# Altium footprint library IC.PcbLib: 386 footprints (part 12 of 30) (continued)
## BGA1924_1.0(45x45) [mm] (continued)
Top Overlay:
  circle w0.25: c-22.845,22.629 r0.125
  region: -21.195,22.779 -22.195,21.779 -22.195,22.779
  lines w0.2: -22.195,21.779 -21.195,22.779 ; -22.195,-22.221 22.805,-22.221 22.805,22.779 -22.195,22.779 -22.195,-22.221
Mechanical 13:
  lines w0.1: -22.195,-22.221 22.805,-22.221 22.805,22.779 -22.195,22.779 -22.195,-22.221
Mechanical 15:
  lines w0.05: -22.695,-22.721 23.305,-22.721 23.305,23.279 -22.695,23.279 -22.695,-22.721
  lines w0.1: -0.195,0.279 0.805,0.279 ; 0.305,-0.221 0.305,0.779
3D body "BGA1924C100P44X44_4500X4500X335.step": height 3.35, standoff 0, extent -22.246,-22.119 22.754,22.881

## CLCC-68N [mm]
height 4.5
pads (68):
  oval 0.65x2.5 smd: 1(0.102,13.95) 2(-1.168,13.95) 3(-2.438,13.95) 4(-3.708,13.95) 5(-4.978,13.95) 6(-6.248,13.95) 7(-7.518,13.95) 8(-8.788,13.95) 9(-10.058,13.95) 27(-10.058,-13.746) 28(-8.788,-13.746) 29(-7.518,-13.746) 30(-6.248,-13.746) 31(-4.978,-13.746) 32(-3.708,-13.746) 33(-2.438,-13.746) 34(-1.168,-13.746) 35(0.102,-13.746) 36(1.372,-13.746) 37(2.642,-13.746) 38(3.912,-13.746) 39(5.182,-13.746) 40(6.452,-13.746) 41(7.722,-13.746) 42(8.992,-13.746) 43(10.262,-13.746) 61(10.262,13.95) 62(8.992,13.95) 63(7.722,13.95) 64(6.452,13.95) 65(5.182,13.95) 66(3.912,13.95) 67(2.642,13.95) 68(1.372,13.95)
  oval 2.5x0.65 smd: 10(-13.746,10.262) 11(-13.746,8.992) 12(-13.746,7.722) 13(-13.746,6.452) 14(-13.746,5.182) 15(-13.746,3.912) 16(-13.746,2.642) 17(-13.746,1.372) 18(-13.746,0.102) 19(-13.746,-1.168) 20(-13.746,-2.438) 21(-13.746,-3.708) 22(-13.746,-4.978) 23(-13.746,-6.248) 24(-13.746,-7.518) 25(-13.746,-8.788) 26(-13.746,-10.058) 44(13.899,-10.058) 45(13.899,-8.788) 46(13.899,-7.518) 47(13.899,-6.248) 48(13.899,-4.978) 49(13.899,-3.708) 50(13.899,-2.438) 51(13.899,-1.168) 52(13.899,0.102) 53(13.899,1.372) 54(13.899,2.642) 55(13.899,3.912) 56(13.899,5.182) 57(13.899,6.452) 58(13.899,7.722) 59(13.899,8.992) 60(13.899,10.262)
Top Overlay:
  circle w0.5: c0.127,15.748 r0.125
  lines w0.2: -0.148,12.802 -0.148,11.302 0.352,11.302 0.352,12.802 ; -12.598,-10.058 -12.598,10.262 -10.058,12.802 10.262,12.802 12.802,10.262 12.802,-10.058 10.262,-12.598 -10.058,-12.598 -12.598,-10.058
Mechanical 13:
  lines w0.1: -11.963,-11.963 -11.963,12.167 12.167,12.167 12.167,-11.963 -11.963,-11.963
Mechanical 15:
  lines w0.05: -14.848,-14.848 -14.848,15.052 15.052,15.052 15.052,-14.848 -14.848,-14.848
  lines w0.1: -0.398,0.102 0.602,0.102 ; 0.102,-0.398 0.102,0.602
3D body: height 7.37, standoff 1.02, extent -11.963,-11.963 12.167,12.167

## DFN6_0.5(1.5X1) [mm]
pads (6):
  rect 0.6x0.23 smd paste+0 mask+0.05: 1(-0.517,0.461) 2(-0.517,-0.039) 3(-0.517,-0.539) 4(0.534,-0.539) 5(0.534,-0.039) 6(0.534,0.461)
Top Overlay:
  circle w0.381: c-1.067,0.483 r0.008
  lines w0.08: -0.432,-0.759 0.457,-0.759 0.457,0.709 -0.432,0.709 -0.432,-0.759
3D body "MAX2659ELT+T.stp": height 0.8, standoff 0, extent -0.537,-0.783 0.563,0.717

## DFN6_0.5-PAD(2X2) [mm]
pads (7):
  rect 0.6x0.3 smd: 1(-0.975,0.449) 2(-0.975,-0.051) 3(-0.975,-0.551) 4(0.925,-0.551) 5(0.925,-0.051) 6(0.925,0.449)
  rect 0.65x1.42 smd: 7(-0.025,-0.051)
Top Overlay:
  circle w0.25: c-1.4,1.099 r0.125
Mechanical 13:
  lines w0.1: -1.025,0.449 -0.525,0.949 ; -1.025,-1.051 0.975,-1.051 0.975,0.949 -1.025,0.949 -1.025,-1.051
Mechanical 15:
  lines w0.05: -1.65,-1.351 1.6,-1.351 1.6,1.249 -1.65,1.249 -1.65,-1.351
3D body "User Library-My-DFN-6-2x2-0_5.STEP": height 0.8, standoff 0, extent -1.085,-1.101 1.035,0.999

## DFN6_0.5-PAD(2X3) [mil]
pads (7):
  rect 29.53x12 smd: 1(-57,20) 2(-57,0) 3(-57,-20) 4(57,-20) 5(57,0) 6(57,20)
  rect 55.12x51.18 smd: 7(0,0)
Top Overlay:
  circle w3.94: c-70,40 r1.97
  lines w6: -59,-39 -33,-39 ; -59,39 -33,39 ; 33,-39 59,-39 ; 33,39 59,39
3D body "User Library-My-DFN-6-2x3-0_5.STEP": height 31.5, standoff 0, extent -61.41,-41.33 61.43,41.34

## DFN6_0.65(2X2) [mm]
pads (6):
  rect 0.7x0.35 smd: 1(-0.898,0.675) 2(-0.898,0.025) 3(-0.898,-0.625) 4(0.999,-0.625) 5(0.999,0.025) 6(0.999,0.675)
Top Overlay:
  circle w0.25: c-1.299,1.35 r0.125
Mechanical 13:
  lines w0.1: -0.949,0.525 -0.449,1.025 ; -0.949,-0.975 -0.949,1.025 1.051,1.025 1.051,-0.975 -0.949,-0.975
Mechanical 15:
  lines w0.05: -1.549,-1.275 -1.549,1.325 1.651,1.325 1.651,-1.275 -1.549,-1.275
3D body "TPS61170DRVT.stp": height 0.8, standoff 0, extent -0.999,-0.975 1.101,1.025

## DFN6_0.65-PAD(2.2X2.5) [mm]
pads (7):
  rect 0.7x0.3 smd: 1(-1.2,0.625) 2(-1.2,-0.025) 3(-1.2,-0.675) 4(1.2,-0.675) 5(1.2,-0.025) 6(1.2,0.625)
  rect 0.85x1.3 smd: 7(0,-0.025)
Top Overlay:
  circle w0.25: c-1.625,1.275 r0.125
Mechanical 13:
  lines w0.1: -1.25,0.45 -0.625,1.075 ; -1.25,-1.125 1.25,-1.125 1.25,1.075 -1.25,1.075 -1.25,-1.125
Mechanical 15:
  lines w0.05: -1.875,-1.425 1.875,-1.425 1.875,1.375 -1.875,1.375 -1.875,-1.425
3D body "LP5900SD-1.5.stp": height 0.8, standoff 0, extent -1.3,-1.125 1.3,1.075

## DFN6_0.65-PAD(2X2) [mm]
pads (7):
  rect 0.6x0.35 smd: 1(-0.999,0.675) 2(-0.999,0.025) 3(-0.999,-0.625) 4(1.101,-0.625) 5(1.101,0.025) 6(1.101,0.675)
  rect 0.8x1.7 smd: 7(0.051,0.025)
Top Overlay:
  circle w0.25: c-1.299,1.35 r0.125
Mechanical 13:
  lines w0.1: -0.949,0.525 -0.449,1.025 ; -0.949,-0.975 -0.949,1.025 1.051,1.025 1.051,-0.975 -0.949,-0.975
Mechanical 15:
  lines w0.05: -1.549,-1.275 -1.549,1.325 1.651,1.325 1.651,-1.275 -1.549,-1.275
3D body "TPS61170DRVT.stp": height 0.8, standoff 0, extent -0.999,-0.975 1.101,1.025

## DFN6_0.95-PAD(3X3) [mm]
pads (7):
  rect 0.75x0.4 smd: 1(-1.45,0.925) 2(-1.45,-0.025) 3(-1.45,-0.975) 4(1.45,-0.975) 5(1.45,-0.025) 6(1.45,0.925)
  rect 1.422x2.2 smd: 7(0,-0.025)
Top Overlay:
  circle w0.25: c-1.875,1.625 r0.125
Mechanical 13:
  lines w0.1: -1.5,0.725 -0.75,1.475 ; -1.5,-1.525 1.5,-1.525 1.5,1.475 -1.5,1.475 -1.5,-1.525
Mechanical 15:
  lines w0.05: -2.125,-1.825 2.125,-1.825 2.125,1.775 -2.125,1.775 -2.125,-1.825
3D body "LP38692SD-3.3_NOPB.stp": height 0.8, standoff 0, extent -1.55,-1.525 1.55,1.475

## DFN6_1.0-PAD(3X3) [mm]
pads (7):
  rect 0.8x0.45 smd: 1(-1.425,1.076) 2(-1.425,0.076) 3(-1.425,-0.924) 4(1.475,-0.924) 5(1.475,0.076) 6(1.475,1.076)
  rect 1.27x2.5 smd: 7(0.025,0.076)
Top Overlay:
  circle w0.25: c-1.875,1.801 r0.125
Mechanical 13:
  lines w0.1: -1.475,0.826 -0.725,1.576 ; -1.475,-1.424 -1.475,1.576 1.525,1.576 1.525,-1.424 -1.475,-1.424
Mechanical 15:
  lines w0.05: -2.125,-1.749 -2.125,1.901 2.175,1.901 2.175,-1.749 -2.125,-1.749
3D body "HDC1080DMBT.stp": height 0.8, standoff 0, extent -1.525,-1.424 1.575,1.576

## DFN8_0.5(2X2) [mm]
pads (8):
  rect 0.7x0.25 smd mask+0.102: 1(-0.925,0.75) 2(-0.925,0.25) 3(-0.925,-0.25) 4(-0.925,-0.75) 5(0.925,-0.75) 6(0.925,-0.25) 7(0.925,0.25) 8(0.925,0.75)
Top Overlay:
  lines w0.2: -1.092,1.118 -0.717,1.118
Mechanical 13:
  lines w0.1: -1,-0.991 1,-0.991 1,0.965 -1,0.965 -1,-0.991
3D body "User Library-DFN08_2X2MM_LT_DC.step": height 0.75, standoff 0, extent -0.959,-1.009 1.041,0.991

## DFN8_0.5-PAD(2X2) [mm]
pads (11):
  rect 0.5x0.3 smd: 1(-1.051,0.775) 2(-1.051,0.275) 3(-1.051,-0.225) 4(-1.051,-0.725) 5(0.949,-0.725) 6(0.949,-0.225) 7(0.949,0.275) 8(0.949,0.775)
  round 0.6 hole 0.3: 9(-0.051,-0.457) 9(-0.051,0.508)
  rect 0.8x1.6 smd: 9(-0.051,0.025)
Top Overlay:
  circle w0.2: c-1.041,1.27 r0.076
Mechanical 13:
  circle w0.1: c-0.251,0.225 r0.4
  lines w0.1: -1.051,-0.975 -1.051,1.025 0.949,1.025 0.949,-0.975 -1.051,-0.975
Mechanical 15:
  lines w0.05: -1.326,-1.075 -1.326,1.125 1.224,1.125 1.224,-1.075 -1.326,-1.075
  lines w0.1: -0.551,0.025 0.449,0.025 ; -0.051,-0.475 -0.051,0.525
3D body "User Library-DFN 8-1.step": height 0.9, standoff 0, extent -1.052,-0.974 0.95,1.026

## DFN8_0.5-PAD(2X3) [mm]
pads (11):
  rect 0.25x0.7 smd mask+0.102: 1(-0.75,-1.052) 2(-0.25,-1.052) 3(0.25,-1.052) 4(0.75,-1.052) 5(0.75,0.95) 6(0.25,0.95) 7(-0.25,0.95) 8(-0.75,0.95)
  round 0.6 hole 0.3: 9(-0.508,-0.051) 9(0.483,-0.051)
  rect 2.2x0.61 smd mask+0.102: 9(0,-0.051)
Top Overlay:
  circle w0.2: c-1.473,-1.422 r0.076
  lines w0.2: -1.55,-0.726 -1.55,-1.101 -1.275,-1.101 ; -1.55,0.624 -1.55,0.999 -1.275,0.999 ; 1.275,-1.101 1.55,-1.101 1.55,-0.726 ; 1.275,0.999 1.55,0.999 1.55,0.624
Mechanical 13:
  circle w0.1: c-0.7,-0.251 r0.4
  lines w0.1: -1.5,-1.051 -1.5,0.949 1.5,0.949 1.5,-1.051 -1.5,-1.051
Mechanical 15:
  lines w0.05: -1.65,-1.426 -1.65,1.324 1.65,1.324 1.65,-1.426 -1.65,-1.426
  lines w0.1: -0.5,-0.051 0.5,-0.051 ; 0,-0.551 0,0.449
3D body "User Library-My-DFN-8-3x2-0_5.STEP": height 0.8, standoff 0, extent -1.55,-1.092 1.55,1.028

## DFN8_0.5-PAD(3X2) [mm]
pads (13):
  rect 0.28x0.7 smd: 1(-0.75,-1.526) 2(-0.25,-1.526) 3(0.25,-1.526) 4(0.75,-1.526) 5(0.75,1.475) 6(0.25,1.475) 7(-0.25,1.475) 8(-0.75,1.475)
  round 0.6 hole 0.3: 9(-0.406,-0.483) 9(-0.406,0.457) 9(0.406,-0.483) 9(0.406,0.457)
  rect 1.63x1.6 smd: 9(0,-0.025)
Top Overlay:
  circle w0.2: c-1.27,-1.6 r0.076
Mechanical 13:
  circle w0.1: c-0.2,-0.725 r0.4
  lines w0.1: -1,-1.525 1,-1.525 1,1.475 -1,1.475 -1,-1.525
Mechanical 15:
  lines w0.05: -1.125,-1.925 1.125,-1.925 1.125,1.875 -1.125,1.875 -1.125,-1.925
  lines w0.1: -0.5,-0.025 0.5,-0.025 ; 0,-0.525 0,0.475
3D body "User Library-DFN-8-2 (2).step": height 0.9, standoff 0, extent -0.994,-1.553 1.006,1.487

## DFN8_0.5-PAD(3X3) [mil]
pads (9):
  rect 32x12 smd: 1(-60,30) 2(-60,10) 3(-60,-10) 4(-60,-30) 5(60,-30) 6(60,-10) 7(60,10) 8(60,30)
  rect 55x79 smd: 9(0,0)
Top Overlay:
  circle w9.84: c-75,54 r4.92
  lines w6: -59,-49 -59,-59 59,-59 59,-49 ; -59,49 -59,59 59,59 59,49 ; -50,49 -39,59
Mechanical 13:
  lines w6: -59,39 -39,59 ; -87,22 cw(c-87,30) -87,38 cw(c-87,30) -87,22 ; -59,-59 -59,59 59,59 59,-59 -59,-59
3D body "User Library-My-DFN-8-3x3-0_5.STEP": height 31.5, standoff 0, extent -61.42,-61.03 61.41,61.02

## DFN8_0.8-PAD(4X4) [mil]
pads (9):
  rect 30x15.75 smd: 1(-75.5,48.5) 2(-75.5,17) 3(-75.5,-14.49) 4(-75.5,-45.99) 5(76,-46.49) 6(76,-14.99) 7(76,16.5) 8(76,48)
  rect 75x122.05 smd: 9(1,1)
Top Overlay:
  circle w9.84: c-94,74 r4.92
  lines w7.87: -77.74,-67.9 -77.74,-77.74 79.74,-77.74 79.74,-67.9 ; -77.74,69.9 -77.74,79.74 79.74,79.74 79.74,69.9
Mechanical 13:
  lines w3.94: -77.74,40.37 -38.37,79.74 ; -77.74,44.31 -42.31,79.74 ; -77.74,48.24 -46.24,79.74 ; -77.74,52.18 -50.18,79.74 ; -77.74,56.12 -54.12,79.74 ; -77.74,60.06 -58.06,79.74 ; -77.74,63.99 -61.99,79.74 ; -77.74,67.93 -65.93,79.74 ; -77.74,71.87 -69.87,79.74 ; -77.74,75.8 -73.8,79.74 ; -77.74,-77.74 79.74,-77.74 79.74,79.74 -77.74,79.74 -77.74,-77.74
Mechanical 15:
  circle w1.97: c1,1 r13.78
  lines w0.04: -79.71,-79.71 81.71,-79.71 81.71,81.71 -79.71,81.71 -79.71,-79.71
  lines w1.97: -18.68,1 20.68,1 ; 1,-18.68 1,20.68 ; -89.55,-89.55 91.55,-89.55 91.55,91.55 -89.55,91.55 -89.55,-89.55
3D body "User Library-SON8-4x4mm.step": height 33.75, standoff 0.28, extent -77.74,-77.74 79.74,79.74